# Altium footprint library ACTION标准库.pcblib: 504 footprints (part 32 of 32)
Each footprint in its own frame and in the unit in brackets; x right, y up, seen from the top. Pads: shape width x height; smd on the part's side, far side on the other; paste and mask are expansions set on the pad; w line width, h text height; cw(c..) or ccw(c..) is an arc to the next point about the centre after c.
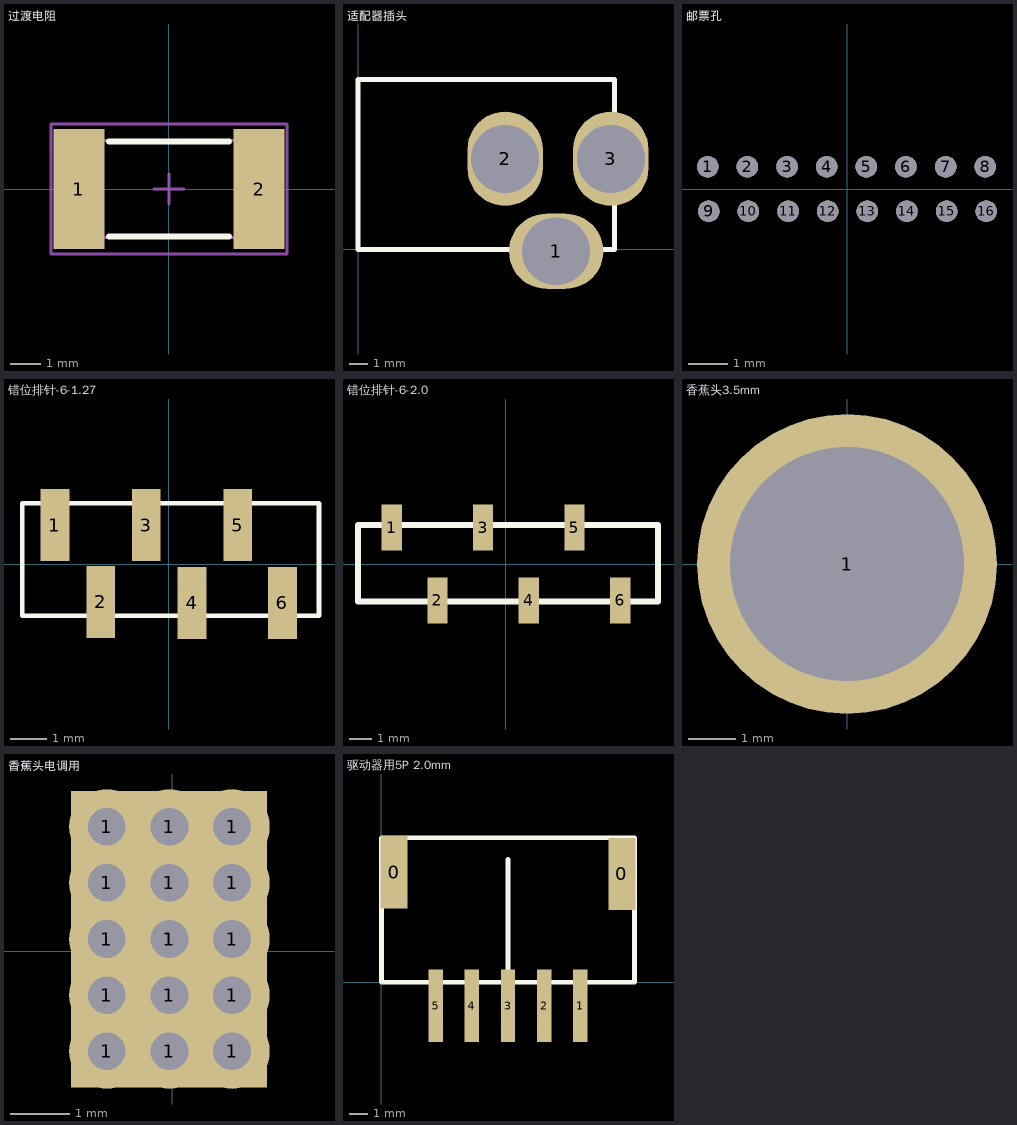
[diagram p31: the footprints below, top view; thin cyan lines are the x and y axes]

## 过渡电阻 [mm] "Chip Resistor, 2-Leads, Body 6.3x3.2mm, IPC Medium Density"
height 0.65
pads (2):
  rect 1.7x4 smd: 1(-3,0) 2(3,0)
Top Overlay:
  lines w0.2: -2,-1.575 2,-1.575 ; -2,1.575 2,1.575
Mechanical 13:
  lines w0.1: -3.175,-1.61 -3.175,1.61 3.175,1.61 3.175,-1.61 -3.175,-1.61
Mechanical 15:
  lines w0.1: -0.5,0 0.5,0 ; 0,-0.5 0,0.5 ; -3.937,-2.159 -3.937,2.159 3.937,2.159 3.937,-2.159 -3.937,-2.159
3D body: height 0.65, standoff 0, extent -3.175,-1.61 3.175,1.61

## 适配器插头 [mm]
pads (3):
  oval 5x4 hole 3.6: 1(10.5,-0.1)
  oval 4x5 hole 3.6: 2(7.8,4.8) 3(13.4,4.8)
Top Overlay:
  lines w0.254: 13.6,8.4 13.6,9 12.4,9 0,9 0,0 13.6,0 13.6,8.5

## 邮票孔 [mm]
pads (16):
  round 0.55 hole 0.55: 1(-3.569,0.572) 2(-2.553,0.572) 3(-1.537,0.572) 4(-0.521,0.572) 5(0.495,0.572) 6(1.511,0.572) 7(2.527,0.572) 8(3.543,0.572) 9(-3.543,-0.572) 10(-2.527,-0.572) 11(-1.511,-0.572) 12(-0.495,-0.572) 13(0.521,-0.572) 14(1.537,-0.572) 15(2.553,-0.572) 16(3.569,-0.572)
Drill Guide:
  lines w0.254: -3.797,-0.826 3.797,-0.826 3.797,0.826 -3.797,0.826 -3.797,-0.826

## 错位排针-6-1.27 [mm]
pads (6):
  rect 0.8x2 smd: 1(-3.162,1.079) 2(-1.892,-1.054) 3(-0.622,1.079) 4(0.648,-1.079) 5(1.918,1.079) 6(3.162,-1.079)
Top Overlay:
  lines w0.127: -4.077,1.689 -4.077,-1.435 4.178,-1.435 4.178,1.689 -4.051,1.689

## 错位排针-6-2.0 [mm]
pads (6):
  rect 0.89x2 smd: 1(-5.002,1.595) 2(-2.998,-1.595) 3(-1.002,1.595) 4(1.002,-1.595) 5(2.998,1.595) 6(5.002,-1.595)
Top Overlay:
  lines w0.254: -5.637,1.707 -6.475,1.707 -6.475,-1.646 6.657,-1.646 6.657,1.707 -5.561,1.707

## 香蕉头3.5mm [mm]
pads (1):
  round 6.4 hole 5: 1(0,0)

## 香蕉头电调用 [mm]
pads (16):
  round 1.27 hole 0.635: 1(-1.097,-1.684) 1(-1.097,-0.738) 1(-1.097,0.208) 1(-1.097,1.154) 1(-1.097,2.101) 1(-0.043,-1.684) 1(-0.043,-0.738) 1(-0.043,0.208) 1(-0.043,1.154) 1(-0.043,2.101) 1(1.011,-1.684) 1(1.011,-0.738) 1(1.011,0.208) 1(1.011,1.154) 1(1.011,2.101)
  rect 3.3x5 all layers, no hole: 1(-0.051,0.203)

## 驱动器用5P 2.0mm [mm]
pads (7):
  rect 1.5x4 all layers, no hole: 0(0.7,6.1) 0(13.3,6)
  rect 0.8x4 all layers, no hole: 1(11,-1.3) 2(9,-1.3) 3(7,-1.3) 4(5,-1.3) 5(3,-1.3)
Top Overlay:
  lines w0.254: 7,-1.3 7,6.8 ; 0,0 14,0 14,8 12.7,8 0,8 0,0